# Altium footprint library TYCO SMD.PcbLib: 21 footprints (part 2 of 2)
Each footprint in its own frame and in the unit in brackets; x right, y up, seen from the top. Pads: shape width x height; smd on the part's side, far side on the other; paste and mask are expansions set on the pad; w line width, h text height; cw(c..) or ccw(c..) is an arc to the next point about the centre after c.
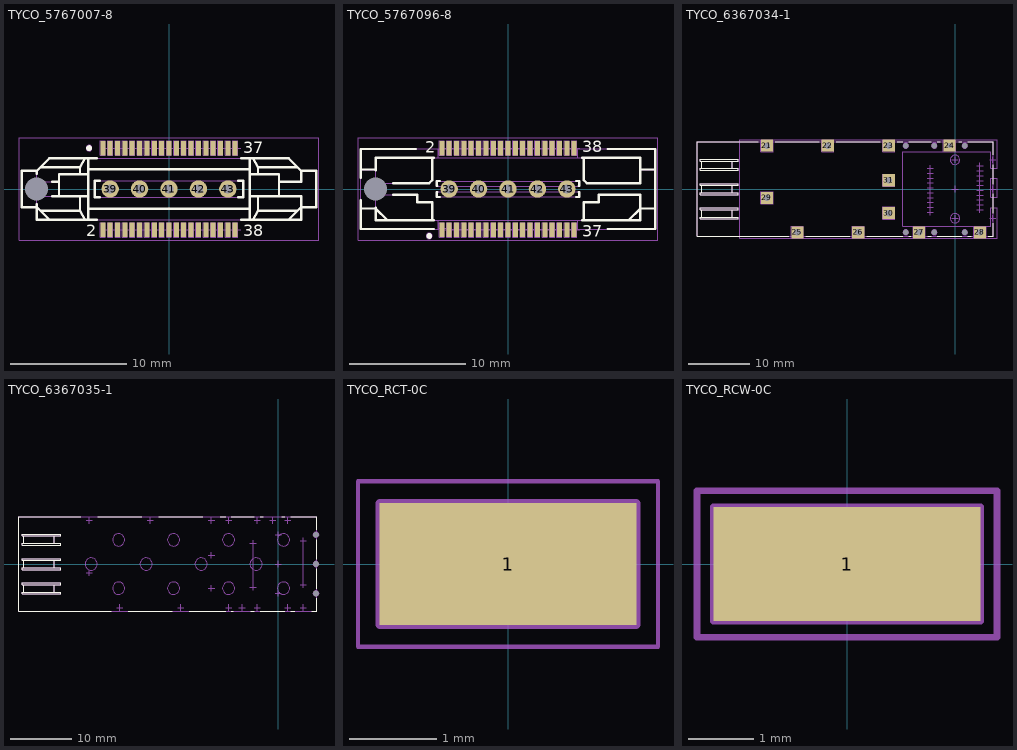
[diagram p1: the footprints below, top view; thin cyan lines are the x and y axes]

## TYCO_5767007-8 [mm] "38 Positions, Pitch 25 [0.64], Centerline Matched Impedance Vertical Plug Connector (MICTOR)"
height 6.81
pads (44):
  rect 0.43x1.27 smd: 1(-5.715,3.53) 2(-5.715,-3.53) 3(-5.08,3.53) 4(-5.08,-3.53) 5(-4.445,3.53) 6(-4.445,-3.53) 7(-3.81,3.53) 8(-3.81,-3.53) 9(-3.175,3.53) 10(-3.175,-3.53) 11(-2.54,3.53) 12(-2.54,-3.53) 13(-1.905,3.53) 14(-1.905,-3.53) 15(-1.27,3.53) 16(-1.27,-3.53) 17(-0.635,3.53) 18(-0.635,-3.53) 19(0,3.53) 20(0,-3.53) 21(0.635,3.53) 22(0.635,-3.53) 23(1.27,3.53) 24(1.27,-3.53) 25(1.905,3.53) 26(1.905,-3.53) 27(2.54,3.53) 28(2.54,-3.53) 29(3.175,3.53) 30(3.175,-3.53) 31(3.81,3.53) 32(3.81,-3.53) 33(4.445,3.53) 34(4.445,-3.53) 35(5.08,3.53) 36(5.08,-3.53) 37(5.715,3.53) 38(5.715,-3.53)
  round 1.5 hole 0.8: 39(-5.08,0) 40(-2.54,0) 41(0,0) 42(2.54,0) 43(5.08,0)
  round 0.5 hole 2 unplated mask+0.75: 44(-11.43,0)
Top Overlay:
  circle w0.25: c-6.9,3.53 r0.125
  lines w0.2: -11.405,-1.325 -11.405,-1.575 ; -11.405,1.325 -11.405,1.575 ; -11.1,-1.88 -7.678,-1.88 ; -11.1,1.88 -7.678,1.88 ; -10.338,-2.642 -11.405,-1.575 ; -10.1,-0.635 -6.96,-0.635 ; -10.1,0.635 -9.5,0.635 ; -9.5,-0.635 -9.5,1.27 -6.96,1.27 ; -7.678,-0.635 -7.678,-1.88 ; -7.678,1.27 -7.678,1.88 ; -7.238,-2.642 -7.678,-1.88 ; -7.238,2.642 -7.678,1.88 ; -6.96,-2.642 -6.96,2.642 ; -6.96,-1.714 6.96,-1.714 ; -6.96,1.714 6.96,1.714 ; -6.239,-2.642 -11.405,-2.642 -11.405,-1.575 ; -6.239,2.642 -10.338,2.642 -11.405,1.575 ; -5.974,-0.724 -6.401,-0.724 -6.401,0.724 -5.974,0.724 ; 5.974,-0.724 6.401,-0.724 6.401,0.724 5.974,0.724 ; 6.239,-2.642 11.405,-2.642 11.405,-1.575 ; 6.239,2.642 10.338,2.642 11.405,1.575 ; 6.96,-2.642 6.96,2.642 ; 6.96,-0.635 11.405,-0.635 11.405,-1.575 ; 6.96,1.27 9.5,1.27 9.5,-0.635 ; 7.238,-2.642 7.678,-1.88 ; 7.238,2.642 7.678,1.88 ; 7.678,-0.635 7.678,-1.88 ; 7.678,1.27 7.678,1.88 ; 9.5,0.635 11.405,0.635 11.405,1.575 ; 10.338,-2.642 11.405,-1.575 ; 11.1,-1.88 7.678,-1.88 ; 11.1,1.88 7.678,1.88 ; -11.405,-1.575 -12.7,-1.575 -12.7,1.575 -11.405,1.575 ; 11.405,-1.575 12.7,-1.575 12.7,1.575 11.405,1.575
  text "37" at 6.425,3.086 h1
  text "38" at 6.4,-4.074 h1
  text "2" at -7.15,-4.086 h1
Mechanical 8:
  drawing of 290 lines, arcs and shapes, not listed
Mechanical 14:
  circle w0.1: c-6.9,3.53 r0.25
  lines w0.1: -11.1,-1.88 -7.678,-1.88 ; -11.1,1.88 -7.678,1.88 ; -10.338,-2.642 -11.405,-1.575 -12.7,-1.575 -12.7,1.575 -11.405,1.575 ; -9.5,-0.635 -9.5,1.27 -6.96,1.27 ; -9.5,0.635 -11.405,0.635 -11.405,1.575 ; -7.678,-0.635 -7.678,-1.88 ; -7.678,1.27 -7.678,1.88 ; -7.238,-2.642 -7.678,-1.88 ; -7.238,2.642 -7.678,1.88 ; -6.96,-2.642 -6.96,2.642 ; -6.96,-1.714 6.96,-1.714 ; -6.96,-0.635 -11.405,-0.635 -11.405,-2.642 11.405,-2.642 11.405,-0.635 6.96,-0.635 ; -6.96,1.714 6.96,1.714 ; -2.691,2.642 -2.691,2.667 -0.47,2.667 -0.47,2.642 ; -1.812,2.642 -1.812,2.667 ; -0.272,2.642 -0.272,2.667 2.576,2.667 2.576,2.642 ; 0.876,2.642 0.876,2.667 ; 1.152,2.642 1.152,2.667 ; 1.428,2.642 1.428,2.667 ; 2.618,2.642 2.618,2.667 5.08,2.667 5.08,2.642 ; 3.35,2.642 3.35,2.667 ; 4.348,2.642 4.348,2.667 ; 6.96,-2.642 6.96,2.642 ; 6.96,1.27 9.5,1.27 9.5,-0.635 ; 7.238,-2.642 7.678,-1.88 ; 7.238,2.642 7.678,1.88 ; 7.678,-0.635 7.678,-1.88 ; 7.678,1.27 7.678,1.88 ; 9.5,0.635 11.405,0.635 11.405,1.575 ; 10.338,-2.642 11.405,-1.575 12.7,-1.575 12.7,1.575 11.405,1.575 ; 11.1,-1.88 7.678,-1.88 ; 11.1,1.88 7.678,1.88 ; -11.405,1.575 -10.338,2.642 10.338,2.642 11.405,1.575 ; -6.401,-0.724 -6.401,0.724 6.401,0.724 6.401,-0.724 -6.401,-0.724
  text "37" at 6.425,3.086 h1
  text "38" at 6.4,-4.074 h1
  text "2" at -7.15,-4.086 h1
Mechanical 15:
  lines w0.1: -12.95,-4.415 12.95,-4.415 12.95,4.415 -12.95,4.415 -12.95,-4.415
3D body "TYCO_5767007-8.stp": height 6.53, standoff -1.37, extent -12.7,-4.356 12.7,4.356

## TYCO_5767096-8 [mm] "38 Positions, Pitch 25 [0.64], Centerline Matched Impedance Vertical Receptacle (MICTOR)"
height 6.14
pads (44):
  rect 0.43x1.27 smd: 1(-5.715,-3.53) 2(-5.715,3.53) 3(-5.08,-3.53) 4(-5.08,3.53) 5(-4.445,-3.53) 6(-4.445,3.53) 7(-3.81,-3.53) 8(-3.81,3.53) 9(-3.175,-3.53) 10(-3.175,3.53) 11(-2.54,-3.53) 12(-2.54,3.53) 13(-1.905,-3.53) 14(-1.905,3.53) 15(-1.27,-3.53) 16(-1.27,3.53) 17(-0.635,-3.53) 18(-0.635,3.53) 19(0,-3.53) 20(0,3.53) 21(0.635,-3.53) 22(0.635,3.53) 23(1.27,-3.53) 24(1.27,3.53) 25(1.905,-3.53) 26(1.905,3.53) 27(2.54,-3.53) 28(2.54,3.53) 29(3.175,-3.53) 30(3.175,3.53) 31(3.81,-3.53) 32(3.81,3.53) 33(4.445,-3.53) 34(4.445,3.53) 35(5.08,-3.53) 36(5.08,3.53) 37(5.715,-3.53) 38(5.715,3.53)
  round 1.5 hole 0.8: 39(-5.08,0) 40(-2.54,0) 41(0,0) 42(2.54,0) 43(5.08,0)
  round 0.5 hole 2 unplated mask+0.75: 44(-11.43,0)
Top Overlay:
  circle w0.25: c-6.8,-4.055 r0.125
  lines w0.2: -12.7,-1.676 -11.43,-1.676 ; -12.7,-0.973 -12.7,-3.454 -6.42,-3.454 ; -12.7,0.973 -12.7,3.454 -7.946,3.454 ; -12.7,1.676 -11.43,1.676 ; -11.43,-1.6 -11.43,-1.676 ; -11.43,1.6 -11.43,2.692 -6.553,2.692 ; -9.913,-0.508 -7.823,-0.508 -7.823,-1.143 -6.553,-1.143 -6.553,-2.692 ; -9.913,0.508 -6.807,0.508 -6.553,0.762 -6.553,2.692 ; -6.42,-2.692 -6.553,-2.692 ; -6.42,2.692 -6.553,2.692 ; -6.099,-0.254 -6.147,-0.254 -6.147,-0.686 -5.875,-0.686 ; -6.099,0.254 -6.147,0.254 -6.147,0.686 -5.875,0.686 ; 5.875,-0.686 6.147,-0.686 6.147,-0.254 6.099,-0.254 ; 5.875,0.686 6.147,0.686 6.147,0.254 6.099,0.254 ; 6.42,-2.692 6.553,-2.692 ; 6.42,2.692 6.553,2.692 ; 8.6,-3.454 12.7,-3.454 12.7,3.454 8.6,3.454 ; 11.43,1.676 12.7,1.676 ; 12.7,-1.676 11.43,-1.676 ; -11.43,-1.676 -10.414,-2.692 ; -11.43,-1.676 -11.43,-2.692 -10.414,-2.692 ; -10.414,-2.692 -6.553,-2.692 ; 6.553,-2.692 10.414,-2.692 ; 6.553,-2.692 6.553,-1.143 7.823,-1.143 7.823,-0.508 11.43,-0.508 11.43,-1.676 ; 6.553,2.692 6.553,0.762 6.807,0.508 11.43,0.508 11.43,2.692 6.553,2.692 ; 10.414,-2.692 11.43,-1.676 ; 10.414,-2.692 11.43,-2.692 11.43,-1.676
  text "2" at -7.125,3.149 h1
  text "37" at 6.4,-4.124 h1
  text "38" at 6.425,3.161 h1
Mechanical 8:
  drawing of 584 lines, arcs and shapes, not listed
Mechanical 14:
  circle w0.1: c-6.8,-4.055 r0.25
  lines w0.1: -12.7,-1.676 -11.43,-1.676 ; -12.7,1.676 -11.43,1.676 ; -6.02,-2.692 -6.02,-3.454 ; -6.02,2.692 -6.02,3.454 ; 6.02,-3.454 6.02,-2.692 ; 6.02,2.692 6.02,3.454 ; 11.43,1.676 12.7,1.676 ; 12.7,-1.676 11.43,-1.676 ; -11.43,-1.676 -11.43,-0.508 -7.823,-0.508 -7.823,-1.143 -6.553,-1.143 -6.553,-2.692 ; -11.43,-1.676 -10.414,-2.692 ; -11.43,-1.676 -11.43,-2.692 -10.414,-2.692 ; -10.414,-2.692 -6.553,-2.692 ; -6.553,-2.692 6.553,-2.692 ; -6.553,2.692 -6.553,0.762 -6.807,0.508 -11.43,0.508 -11.43,2.692 -6.553,2.692 ; -6.553,2.692 6.553,2.692 ; -6.02,-3.454 -12.7,-3.454 -12.7,3.454 12.7,3.454 12.7,-3.454 -5.004,-3.454 -5.004,-3.391 -6.02,-3.391 -6.02,-3.454 ; 6.553,-2.692 10.414,-2.692 ; 6.553,-2.692 6.553,-1.143 7.823,-1.143 7.823,-0.508 11.43,-0.508 11.43,-1.676 ; 6.553,2.692 6.553,0.762 6.807,0.508 11.43,0.508 11.43,2.692 6.553,2.692 ; 10.414,-2.692 11.43,-1.676 ; 10.414,-2.692 11.43,-2.692 11.43,-1.676 ; -6.147,-0.686 6.147,-0.686 6.147,-0.254 -6.147,-0.254 -6.147,-0.686 ; -6.147,0.254 6.147,0.254 6.147,0.686 -6.147,0.686 -6.147,0.254
  text "2" at -7.125,3.149 h1
  text "37" at 6.4,-4.124 h1
  text "38" at 6.425,3.161 h1
Mechanical 15:
  lines w0.1: -12.95,-4.415 12.95,-4.415 12.95,4.415 -12.95,4.415 -12.95,-4.415
3D body "TYCO_5767096-8.stp": height 6, standoff -1.39, extent -12.7,-4.356 12.7,4.356

## TYCO_6367034-1 [mm] "Cage bottom For Single Port SFP  (Small Form-factor Pluggable)"
height 8.8
pads (17):
  rect 2x2 hole 1.05: 21(-30.9,7.125) 22(-20.9,7.125) 23(-10.9,7.125) 25(-25.9,-7.125) 26(-15.9,-7.125) 27(-5.9,-7.125) 28(4.1,-7.125) 29(-30.9,-1.455) 30(-10.9,-3.955) 31(-10.9,1.445)
  rect 2x2 hole 0.85: 24(-0.9,7.125)
  round 0.5 hole 0.95 unplated mask+0.225: 32(-8.1,7.125) 33(-3.4,7.125) 34(1.6,7.125) 35(-8.1,-7.125) 36(-3.4,-7.125) 37(1.6,-7.125)
Top Overlay:
  lines w0.2: -41.65,-4.605 -41.65,-3.405 ; -41.65,-0.605 -41.65,0.595 ; -41.65,3.395 -41.65,4.595 ; -36.6,-4.605 -36.6,-3.405 ; -36.6,-0.605 -36.6,0.595 ; -36.6,3.395 -36.6,4.595 ; -32.3,7.774 -42.4,7.774 -42.4,-7.774 -27.3,-7.774 ; -29.5,7.774 -22.3,7.774 ; -24.5,-7.774 -17.3,-7.774 ; -19.5,7.774 -12.3,7.774 ; -14.5,-7.774 -8.568,-7.774 ; -9.5,7.774 -8.568,7.774 ; -7.632,-7.774 -7.3,-7.774 ; -7.632,7.774 -3.868,7.774 ; -4.5,-7.774 -3.868,-7.774 ; -2.932,-7.774 1.132,-7.774 ; -2.932,7.774 -2.4,7.774 ; 0.6,7.774 1.132,7.774 ; 2.068,-7.774 2.7,-7.774 ; 2.068,7.774 6.3,7.774 6.3,5.589 ; 5.5,-7.774 6.3,-7.774 6.3,-5.599 ; 6.3,-4.011 6.3,-0.799 ; 6.3,0.789 6.3,4.001 ; -41.9,-4.905 -35.6,-4.905 -35.6,-4.605 -41.9,-4.605 -41.9,-4.905 ; -41.9,-3.405 -35.6,-3.405 -35.6,-3.105 -41.9,-3.105 -41.9,-3.405 ; -41.9,-0.905 -35.6,-0.905 -35.6,-0.605 -41.9,-0.605 -41.9,-0.905 ; -41.9,0.595 -35.6,0.595 -35.6,0.895 -41.9,0.895 -41.9,0.595 ; -41.9,3.095 -35.6,3.095 -35.6,3.395 -41.9,3.395 -41.9,3.095 ; -41.9,4.595 -35.6,4.595 -35.6,4.895 -41.9,4.895 -41.9,4.595
Mechanical 8:
  drawing of 213 lines, arcs and shapes, not listed
Mechanical 14:
  lines w0.1: -41.65,-4.605 -41.65,-3.405 ; -41.65,-0.605 -41.65,0.595 ; -41.65,3.395 -41.65,4.595 ; -36.6,-4.605 -36.6,-3.405 ; -36.6,-0.605 -36.6,0.595 ; -36.6,3.395 -36.6,4.595 ; -42.4,-7.774 -42.4,7.774 6.3,7.774 6.3,-7.774 -42.4,-7.774 ; -41.9,-4.905 -35.6,-4.905 -35.6,-4.605 -41.9,-4.605 -41.9,-4.905 ; -41.9,-3.405 -35.6,-3.405 -35.6,-3.105 -41.9,-3.105 -41.9,-3.405 ; -41.9,-0.905 -35.6,-0.905 -35.6,-0.605 -41.9,-0.605 -41.9,-0.905 ; -41.9,0.595 -35.6,0.595 -35.6,0.895 -41.9,0.895 -41.9,0.595 ; -41.9,3.095 -35.6,3.095 -35.6,3.395 -41.9,3.395 -41.9,3.095 ; -41.9,4.595 -35.6,4.595 -35.6,4.895 -41.9,4.895 -41.9,4.595
3D body "TYCO_6367034-1_(Cage Bot).stp": height 8.8, standoff -1.1, extent -42.4,-7.774 6.1,7.774

## TYCO_6367035-1 [mm] "Cage Top For Single Port SFP  (Small Form-factor Pluggable)"
height 10
pads (3):
  round 0.5 hole 0.95 unplated mask+0.225: 32(6.2,4.795) 33(6.2,-0.005) 34(6.2,-4.805)
Top Overlay:
  lines w0.2: -41.65,-4.605 -41.65,-3.405 ; -41.65,-0.605 -41.65,0.595 ; -41.65,3.395 -41.65,4.595 ; -36.6,-4.605 -36.6,-3.405 ; -36.6,-0.605 -36.6,0.595 ; -36.6,3.395 -36.6,4.595 ; -32.3,7.774 -42.4,7.774 -42.4,-7.774 -27.3,-7.774 ; -29.5,7.774 -22.3,7.774 ; -24.5,-7.774 -17.3,-7.774 ; -19.5,7.774 -12.3,7.774 ; -14.5,-7.774 -8.568,-7.774 ; -9.5,7.774 -8.568,7.774 ; -7.632,-7.774 -7.3,-7.774 ; -7.632,7.774 -3.868,7.774 ; -4.5,-7.774 -3.868,-7.774 ; -2.932,-7.774 1.132,-7.774 ; -2.932,7.774 -2.4,7.774 ; 0.6,7.774 1.132,7.774 ; 2.068,-7.774 2.7,-7.774 ; 2.068,7.774 6.3,7.774 6.3,5.589 ; 5.5,-7.774 6.3,-7.774 6.3,-5.599 ; 6.3,-4.011 6.3,-0.799 ; 6.3,0.789 6.3,4.001 ; -41.9,-4.905 -35.6,-4.905 -35.6,-4.605 -41.9,-4.605 -41.9,-4.905 ; -41.9,-3.405 -35.6,-3.405 -35.6,-3.105 -41.9,-3.105 -41.9,-3.405 ; -41.9,-0.905 -35.6,-0.905 -35.6,-0.605 -41.9,-0.605 -41.9,-0.905 ; -41.9,0.595 -35.6,0.595 -35.6,0.895 -41.9,0.895 -41.9,0.595 ; -41.9,3.095 -35.6,3.095 -35.6,3.395 -41.9,3.395 -41.9,3.095 ; -41.9,4.595 -35.6,4.595 -35.6,4.895 -41.9,4.895 -41.9,4.595
Mechanical 8:
  circle w0.1: c6.2,-4.805 r0.425
  circle w0.1: c6.2,-0.005 r0.425
  circle w0.1: c6.2,4.795 r0.425
  lines w0.1: -31.4,-1.455 -30.9,-1.455 ; -31.4,7.125 -30.9,7.125 ; -30.9,-1.955 -30.9,-1.455 ; -30.9,-0.955 -30.9,-1.455 ; -30.9,6.625 -30.9,7.125 ; -30.9,7.625 -30.9,7.125 ; -30.4,-1.455 -30.9,-1.455 ; -30.4,7.125 -30.9,7.125 ; -26.4,-7.125 -25.9,-7.125 ; -25.9,-7.625 -25.9,-7.125 ; -25.9,-6.625 -25.9,-7.125 ; -25.4,-7.125 -25.9,-7.125 ; -21.4,7.125 -20.9,7.125 ; -20.9,6.625 -20.9,7.125 ; -20.9,7.625 -20.9,7.125 ; -20.4,7.125 -20.9,7.125 ; -16.4,-7.125 -15.9,-7.125 ; -15.9,-7.625 -15.9,-7.125 ; -15.9,-6.625 -15.9,-7.125 ; -15.4,-7.125 -15.9,-7.125 ; -11.4,-3.955 -10.9,-3.955 ; -11.4,1.445 -10.9,1.445 ; -11.4,7.125 -10.9,7.125 ; -10.9,-4.455 -10.9,-3.955 ; -10.9,-3.455 -10.9,-3.955 ; -10.9,0.945 -10.9,1.445 ; -10.9,1.945 -10.9,1.445 ; -10.9,6.625 -10.9,7.125 ; -10.9,7.625 -10.9,7.125 ; -10.4,-3.955 -10.9,-3.955 ; -10.4,1.445 -10.9,1.445 ; -10.4,7.125 -10.9,7.125 ; -8.6,-7.125 -8.1,-7.125 ; -8.6,7.125 -8.1,7.125 ; -8.1,-7.625 -8.1,-7.125 ; -8.1,-6.625 -8.1,-7.125 ; -8.1,6.625 -8.1,7.125 ; -8.1,7.625 -8.1,7.125 ; -7.6,-7.125 -8.1,-7.125 ; -7.6,7.125 -8.1,7.125 ; -6.4,-7.125 -5.9,-7.125 ; -5.9,-7.625 -5.9,-7.125 ; -5.9,-6.625 -5.9,-7.125 ; -5.4,-7.125 -5.9,-7.125 ; -4.6,-3.805 -4.1,-3.805 -3.6,-3.805 ; -4.6,3.395 -4.1,3.395 -3.6,3.395 ; -4.1,-4.305 -4.1,3.895 ; -3.9,-7.125 -3.4,-7.125 ; -3.9,7.125 -3.4,7.125 ; -3.4,-7.625 -3.4,-7.125 ; -3.4,-6.625 -3.4,-7.125 ; -3.4,6.625 -3.4,7.125 ; -3.4,7.625 -3.4,7.125 ; -2.9,-7.125 -3.4,-7.125 ; -2.9,7.125 -3.4,7.125 ; -1.4,7.125 -0.9,7.125 ; -0.9,6.625 -0.9,7.125 ; -0.9,7.625 -0.9,7.125 ; -0.5,-4.805 0,-4.805 ; -0.5,0 0,0 ; -0.5,4.795 0,4.795 ; -0.4,7.125 -0.9,7.125 ; 0,-5.305 0,-4.805 ; 0,-4.305 0,-4.805 ; 0,-0.5 0,0 ; 0,0.5 0,0 ; 0,4.295 0,4.795 ; 0,5.295 0,4.795 ; 0.5,-4.805 0,-4.805 ; 0.5,0 0,0 ; 0.5,4.795 0,4.795 ; 1.1,-7.125 1.6,-7.125 ; 1.1,7.125 1.6,7.125 ; 1.6,-7.625 1.6,-7.125 ; 1.6,-6.625 1.6,-7.125 ; 1.6,6.625 1.6,7.125 ; 1.6,7.625 1.6,7.125 ; 2.1,-7.125 1.6,-7.125 ; 2.1,7.125 1.6,7.125 ; 3.6,-7.125 4.1,-7.125 ; 3.6,-3.405 4.1,-3.405 4.6,-3.405 ; 3.6,3.795 4.1,3.795 4.6,3.795 ; 4.1,-7.625 4.1,-7.125 ; 4.1,-6.625 4.1,-7.125 ; 4.1,-3.905 4.1,4.295 ; 4.6,-7.125 4.1,-7.125 ; 5.7,-4.805 6.2,-4.805 ; 5.7,-0.005 6.2,-0.005 ; 5.7,4.795 6.2,4.795 ; 6.2,-5.305 6.2,-4.805 ; 6.2,-4.305 6.2,-4.805 ; 6.2,-0.505 6.2,-0.005 ; 6.2,0.495 6.2,-0.005 ; 6.2,4.295 6.2,4.795 ; 6.2,5.295 6.2,4.795 ; 6.7,-4.805 6.2,-4.805 ; 6.7,-0.005 6.2,-0.005 ; 6.7,4.795 6.2,4.795
Mechanical 14:
  circle w0.1: c0.9,3.945 r1
  circle w0.1: c0.9,-3.955 r1
  circle w0.1: c-3.6,-0.005 r1
  circle w0.1: c-8.1,-3.955 r1
  circle w0.1: c-8.1,3.945 r1
  circle w0.1: c-17.1,3.945 r1
  circle w0.1: c-12.6,-0.005 r1
  circle w0.1: c-17.1,-3.955 r1
  circle w0.1: c-21.6,-0.005 r1
  circle w0.1: c-26.1,-3.955 r1
  circle w0.1: c-30.6,-0.005 r1
  circle w0.1: c-26.1,3.945 r1
  lines w0.1: -41.65,-4.605 -41.65,-3.405 ; -41.65,-0.605 -41.65,0.595 ; -41.65,3.395 -41.65,4.595 ; -36.6,-4.605 -36.6,-3.405 ; -36.6,-0.605 -36.6,0.595 ; -36.6,3.395 -36.6,4.595 ; -42.4,-7.774 -42.4,7.774 6.3,7.774 6.3,-7.774 -42.4,-7.774 ; -41.9,-4.905 -35.6,-4.905 -35.6,-4.605 -41.9,-4.605 -41.9,-4.905 ; -41.9,-3.405 -35.6,-3.405 -35.6,-3.105 -41.9,-3.105 -41.9,-3.405 ; -41.9,-0.905 -35.6,-0.905 -35.6,-0.605 -41.9,-0.605 -41.9,-0.905 ; -41.9,0.595 -35.6,0.595 -35.6,0.895 -41.9,0.895 -41.9,0.595 ; -41.9,3.095 -35.6,3.095 -35.6,3.395 -41.9,3.395 -41.9,3.095 ; -41.9,4.595 -35.6,4.595 -35.6,4.895 -41.9,4.895 -41.9,4.595
3D body "TYCO_6367035-1_(Cage Top).stp": height 10.34, standoff -1.19, extent -42.4,-7.774 6.3,7.886

## TYCO_RCT-0C [mm] "0805 (2012) Surface Mount PCB Test Point"
height 1.45
pads (1):
  rect 2.95x1.4 smd: 1(0,0)
Mechanical 8:
  lines w0.1: -0.5,0 0,0 ; 0,-0.5 0,0 ; 0,0.5 0,0 ; 0.5,0 0,0 ; -1.475,-0.7 -1.475,0.7 1.475,0.7 1.475,-0.7 -1.475,-0.7
Mechanical 14:
  lines w0.1: -0.75,-0.625 -1,-0.375 -1,0.375 -0.75,0.625 ; -0.25,-0.625 -0.25,-0.525 0.25,-0.525 0.25,-0.625 ; -0.25,0.625 -0.25,0.525 0.25,0.525 0.25,0.625 ; 0.75,-0.625 1,-0.375 1,0.375 0.75,0.625 ; -1,-0.625 1,-0.625 1,0.625 -1,0.625 -1,-0.625
Mechanical 15:
  lines w0.05: -1.725,-0.95 -1.725,0.95 1.725,0.95 1.725,-0.95 -1.725,-0.95
3D body "TYCO_RCT-0C.stp": height 1.45, standoff 0, extent -1,-0.625 1,0.625

## TYCO_RCW-0C [mm] "1206 (3216) Surface Mount PCB Test Point"
height 2
pads (1):
  rect 4.1x1.75 smd: 1(0,0)
Mechanical 8:
  lines w0.1: -0.5,0 0,0 ; 0,-0.5 0,0 ; 0,0.5 0,0 ; 0.5,0 0,0 ; -2.05,-0.875 -2.05,0.875 2.05,0.875 2.05,-0.875 -2.05,-0.875
Mechanical 14:
  lines w0.1: -1.12,-0.8 -1.12,-0.5 -1.32,-0.3 -1.32,0.3 -1.12,0.5 -1.12,0.8 ; -0.72,-0.8 -0.72,-0.65 -0.42,-0.65 -0.42,-0.5 0,-0.5 ; -0.72,0.8 -0.72,0.65 -0.42,0.65 -0.42,0.5 0,0.5 ; 0,-0.8 0,-0.5 ; 0,0.8 0,0.5 ; 0.72,-0.8 0.72,-0.65 0.42,-0.65 0.42,-0.5 0,-0.5 ; 0.72,0.8 0.72,0.65 0.42,0.65 0.42,0.5 0,0.5 ; 1.12,-0.8 1.12,-0.5 1.32,-0.3 1.32,0.3 1.12,0.5 1.12,0.8 ; -1.599,-0.8 1.6,-0.8 1.6,0.8 -1.599,0.8 -1.599,-0.8
Mechanical 15:
  lines w0.1: -2.3,-1.125 -2.3,1.125 2.3,1.125 2.3,-1.125 -2.3,-1.125
3D body "TYCO_RCW-0C.stp": height 2, standoff 0, extent -1.6,-0.8 1.6,0.8